# Altium footprint library IC.PcbLib: 386 footprints (part 25 of 30)
Each footprint in its own frame and in the unit in brackets; x right, y up, seen from the top. Pads: shape width x height; smd on the part's side, far side on the other; paste and mask are expansions set on the pad; w line width, h text height; cw(c..) or ccw(c..) is an arc to the next point about the centre after c.
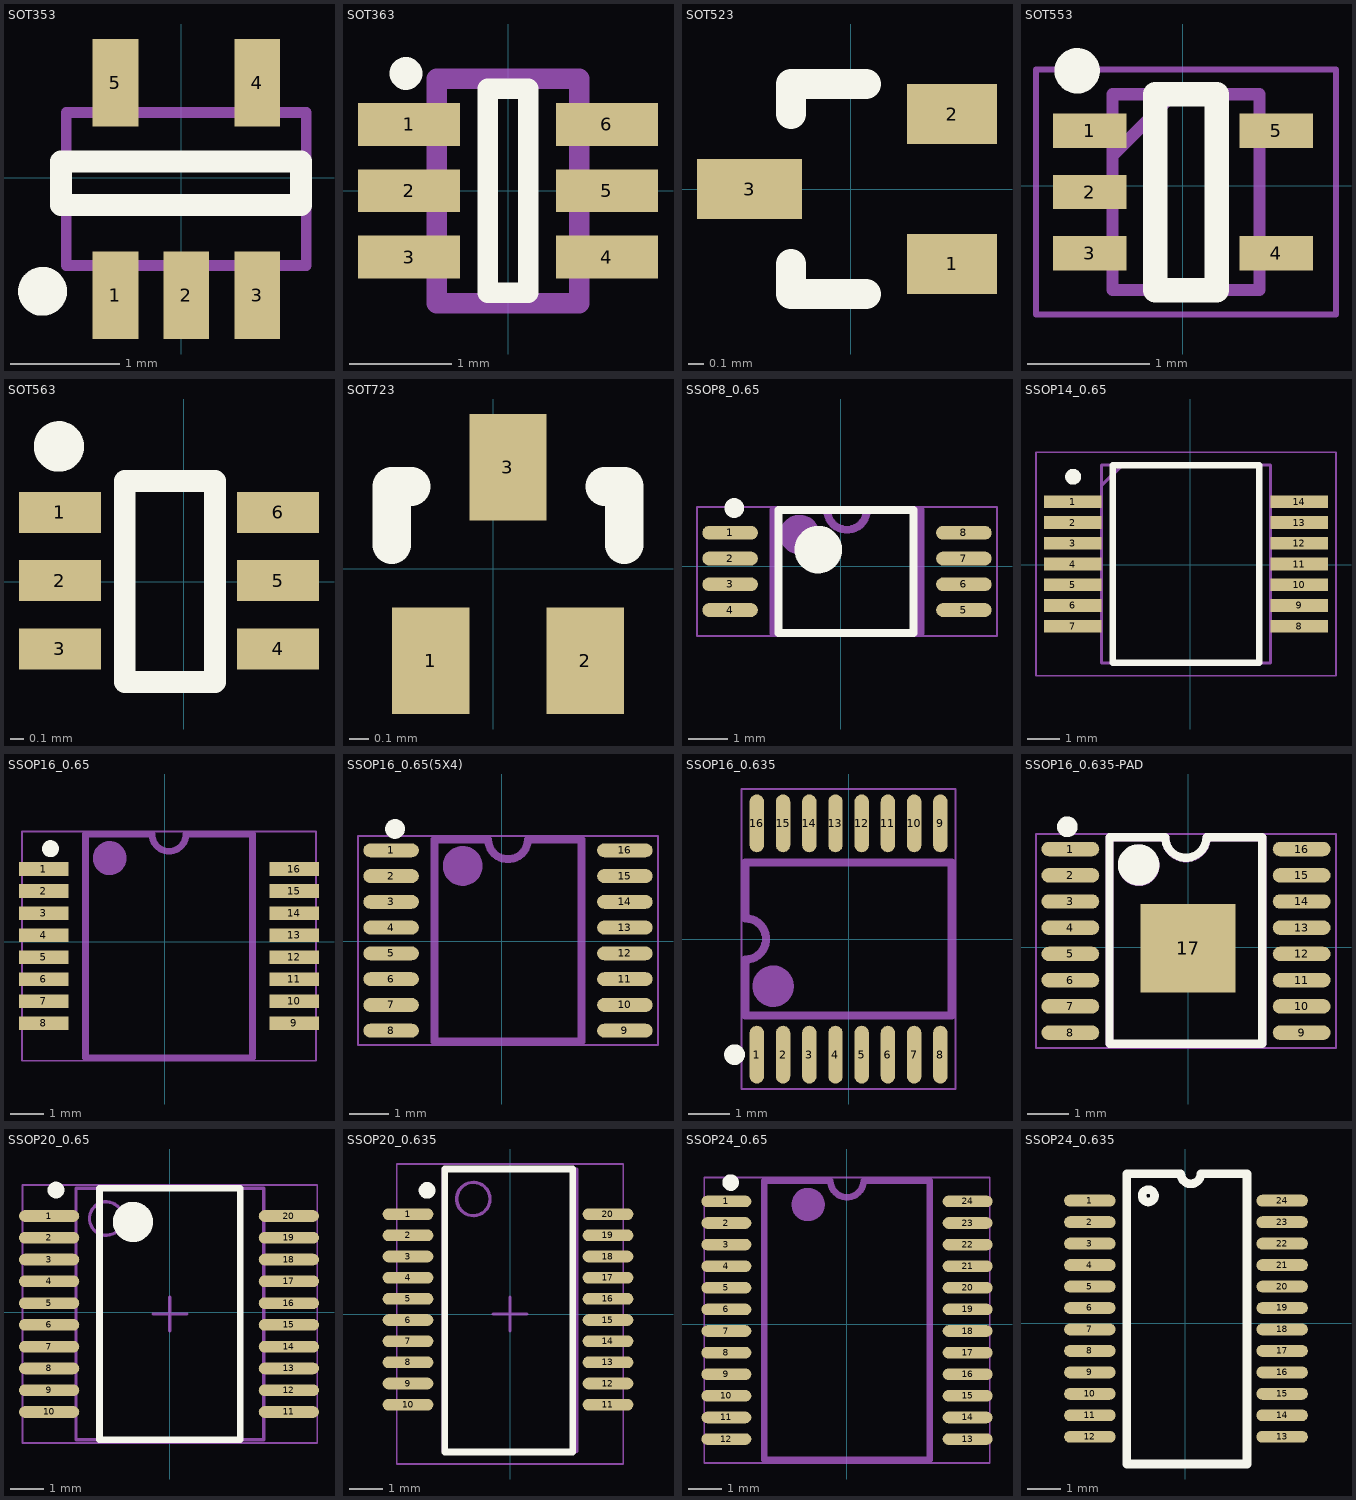
[diagram p24: the footprints below, top view; thin cyan lines are the x and y axes]

## SOT353 [mm]
height 1.45
pads (5):
  rect 0.42x0.8 smd mask+0.051: 1(-0.602,-1.078) 2(0.048,-1.078) 3(0.698,-1.078) 4(0.698,0.872) 5(-0.602,0.872)
Top Overlay:
  circle w0.25: c-1.27,-1.041 r0.099
  lines w0.2: -1.1,-0.251 -1.1,0.149 1.1,0.149 1.1,-0.251 -1.1,-0.251
Mechanical 13:
  lines w0.1: -1.052,-0.803 -1.052,0.597 1.148,0.597 1.148,-0.803 -1.052,-0.803
3D body "User Library-SOT353-1.step": height 1.1, standoff 0, extent -1.052,-1.328 1.148,1.072

## SOT363 [mm]
pads (6):
  rect 1x0.42 smd mask+0.051: 1(-0.97,0.65) 2(-0.97,0) 3(-0.97,-0.65) 4(0.97,-0.65) 5(0.97,0) 6(0.97,0.65)
Top Overlay:
  circle w0.25: c-1,1.15 r0.035
  lines w0.2: -0.2,-1 0.2,-1 0.2,1 -0.2,1 -0.2,-1
Mechanical 13:
  lines w0.2: -0.7,-1.1 -0.7,1.1 0.7,1.1 0.7,-1.1 -0.7,-1.1
3D body "User Library-SOT363-2.STEP": height 1.1, standoff 0, extent -1.2,-1.1 1.2,1.1

## SOT523 [mm]
pads (3):
  rect 0.6x0.4 smd: 1(0.675,-0.5) 2(0.675,0.5)
  rect 0.7x0.4 smd: 3(-0.675,0)
Top Overlay:
  lines w0.2: -0.4,-0.5 -0.4,-0.7 0.1,-0.7 ; -0.4,0.5 -0.4,0.7 0.1,0.7
3D body "User Library-SOT-523.STEP": height 0.8, standoff 0, extent -0.8,-0.8 0.8,0.8

## SOT553 [mm]
height 1.45
pads (5):
  rect 0.6x0.28 smd: 1(-0.762,0.449) 2(-0.762,-0.051) 3(-0.762,-0.551) 4(0.762,-0.551) 5(0.762,0.449)
Top Overlay:
  circle w0.25: c-0.864,0.94 r0.06
  lines w0.2: -0.225,-0.851 0.275,-0.851 0.275,0.749 -0.225,0.749 -0.225,-0.851
Mechanical 13:
  lines w0.1: -0.575,0.249 -0.075,0.749 ; -0.575,-0.851 0.625,-0.851 0.625,0.749 -0.575,0.749 -0.575,-0.851
Mechanical 15:
  lines w0.05: -1.2,-1.051 1.25,-1.051 1.25,0.949 -1.2,0.949 -1.2,-1.051
3D body "User Library-sot-553.STEP": height 0.5, standoff 0, extent -0.8,-0.851 0.8,0.749

## SOT563 [mm]
height 1.45
pads (6):
  rect 0.6x0.3 smd mask+0.051: 1(-0.908,0.507) 2(-0.908,0.007) 3(-0.908,-0.493) 4(0.692,-0.493) 5(0.692,0.007) 6(0.692,0.507)
Top Overlay:
  circle w0.25: c-0.914,0.991 r0.06
  lines w0.16: -0.432,-0.737 -0.432,0.737 0.229,0.737 0.229,-0.737 -0.432,-0.737
3D body "User Library-SOT-563.step": height 0.58, standoff 0, extent -0.92,-0.793 0.705,0.807

## SOT723 [mm]
height 1.45
pads (3):
  rect 0.4x0.55 smd: 1(-0.324,-0.475) 2(0.476,-0.475) 3(0.076,0.525)
Top Overlay:
  lines w0.2: -0.524,0.125 -0.524,0.425 -0.424,0.425 ; 0.576,0.425 0.676,0.425 0.676,0.125
3D body "User Library-SOT-723.STEP": height 0.45, standoff -0.01, extent -0.549,-0.5 0.701,0.55

## SSOP8_0.65 [mm]
height 1.2
pads (8):
  oval 1.4x0.35 smd: 1(-2.798,0.848) 2(-2.798,0.198) 3(-2.798,-0.452) 4(-2.798,-1.102) 5(3.102,-1.102) 6(3.102,-0.452) 7(3.102,0.198) 8(3.102,0.848)
Top Overlay:
  circle w0.25: c-2.692,1.473 r0.125
  circle w0.6: c-0.573,0.423 r0.3
  lines w0.2: -1.573,-1.677 -1.573,1.423 1.827,1.423 1.827,-1.677 -1.573,-1.677
Mechanical 15:
  circle w0.6: c-1.041,0.803 r0.2
  lines w0.05: -3.632,-1.753 3.937,-1.753 3.937,1.499 -3.632,1.499 -3.632,-1.753
  lines w0.2: -1.698,-1.677 2.002,-1.677 2.002,1.423 0.652,1.423 cw(c0.152,1.423) -0.348,1.423 -1.698,1.423 -1.698,-1.677
3D body "User Library-SSOP-8-2.STEP": height 1.3, standoff 0, extent -3.022,-1.852 3.378,1.648

## SSOP14_0.65 [mm]
height 1.2
pads (14):
  rect 1.8x0.4 smd: 1(-3.677,1.975) 2(-3.677,1.325) 3(-3.677,0.675) 4(-3.677,0.025) 5(-3.677,-0.625) 6(-3.677,-1.275) 7(-3.677,-1.925) 8(3.423,-1.925) 9(3.423,-1.275) 10(3.423,-0.625) 11(3.423,0.025) 12(3.423,0.675) 13(3.423,1.325) 14(3.423,1.975)
Top Overlay:
  circle w0.25: c-3.663,2.759 r0.125
  lines w0.2: -2.427,-3.075 2.173,-3.075 2.173,3.125 -2.427,3.125 -2.427,-3.075
Mechanical 13:
  lines w0.1: -2.777,2.475 -2.127,3.125 ; -2.777,-3.075 2.523,-3.075 2.523,3.125 -2.777,3.125 -2.777,-3.075
Mechanical 15:
  lines w0.05: -4.827,-3.475 4.573,-3.475 4.573,3.525 -4.827,3.525 -4.827,-3.475
3D body "NE556DBR.stp": height 2, standoff 0, extent -4.027,-3.075 3.773,3.125

## SSOP16_0.65 [mm]
pads (16):
  rect 1.46x0.4 smd: 1(-3.573,2.148) 2(-3.573,1.498) 3(-3.573,0.848) 4(-3.573,0.198) 5(-3.573,-0.452) 6(-3.573,-1.102) 7(-3.573,-1.752) 8(-3.573,-2.402) 9(3.827,-2.402) 10(3.827,-1.752) 11(3.827,-1.102) 12(3.827,-0.452) 13(3.827,0.198) 14(3.827,0.848) 15(3.827,1.498) 16(3.827,2.148)
Top Overlay:
  circle w0.25: c-3.373,2.749 r0.125
Mechanical 15:
  circle w0.6: c-1.626,2.47 r0.2
  lines w0.05: -4.216,-3.511 -4.216,3.257 4.47,3.257 4.47,-3.511 -4.216,-3.511
  lines w0.2: -2.337,-3.427 -2.337,3.173 -0.373,3.173 ccw(c0.127,3.173) 0.627,3.173 2.591,3.173 2.591,-3.427 -2.337,-3.427
3D body "SSOP16-0.65-1.STEP": height 1.99, standoff 0.01, extent -3.822,-3.289 4.077,3.035

## SSOP16_0.65(5X4) [mm]
pads (16):
  oval 1.4x0.35 smd: 1(-2.798,2.3) 2(-2.798,1.65) 3(-2.798,1) 4(-2.798,0.35) 5(-2.798,-0.3) 6(-2.798,-0.95) 7(-2.798,-1.6) 8(-2.798,-2.25) 9(3.102,-2.25) 10(3.102,-1.6) 11(3.102,-0.95) 12(3.102,-0.3) 13(3.102,0.35) 14(3.102,1) 15(3.102,1.65) 16(3.102,2.3)
Top Overlay:
  circle w0.25: c-2.698,2.84 r0.125
Mechanical 15:
  circle w0.6: c-0.991,1.905 r0.2
  lines w0.05: -3.632,-2.616 -3.632,2.667 3.937,2.667 3.937,-2.616 -3.632,-2.616
  lines w0.2: -1.698,-2.525 -1.698,2.575 -0.348,2.575 ccw(c0.152,2.575) 0.652,2.575 2.002,2.575 2.002,-2.525 -1.698,-2.525
3D body "User Library-ssop16p500x440ls065h200.step": height 2, standoff 0, extent -2.997,-2.475 3.403,2.525

## SSOP16_0.635 [mm]
height 1.1
pads (16):
  oval 0.35x1.4 smd: 1(-2.222,-2.8) 2(-1.587,-2.8) 3(-0.952,-2.8) 4(-0.317,-2.8) 5(0.318,-2.8) 6(0.953,-2.8) 7(1.588,-2.8) 8(2.223,-2.8) 9(2.223,2.8) 10(1.588,2.8) 11(0.953,2.8) 12(0.318,2.8) 13(-0.317,2.8) 14(-0.952,2.8) 15(-1.587,2.8) 16(-2.222,2.8)
Top Overlay:
  circle w0.25: c-2.762,-2.8 r0.125
Mechanical 15:
  circle w0.6: c-1.827,-1.143 r0.2
  lines w0.05: -2.589,-3.632 2.591,-3.632 2.591,3.632 -2.589,3.632 -2.589,-3.632
  lines w0.2: -2.5,-1.85 2.5,-1.85 2.5,1.85 -2.5,1.85 -2.5,0.5 cw(c-2.5,0) -2.5,-0.5 -2.5,-1.85
3D body "SSOP16-0.635.STEP": height 1.1, standoff 0, extent -2.527,-2.997 2.451,2.997

## SSOP16_0.635-PAD [mm]
height 1.1
pads (17):
  oval 1.4x0.35 smd: 1(-2.851,2.375) 2(-2.851,1.74) 3(-2.851,1.105) 4(-2.851,0.47) 5(-2.851,-0.165) 6(-2.851,-0.8) 7(-2.851,-1.435) 8(-2.851,-2.07) 9(2.749,-2.07) 10(2.749,-1.435) 11(2.749,-0.8) 12(2.749,-0.165) 13(2.749,0.47) 14(2.749,1.105) 15(2.749,1.74) 16(2.749,2.375)
  rect 2.3x2.15 smd: 17(0,-0.025)
Top Overlay:
  circle w0.25: c-2.927,2.914 r0.125
  circle w0.6: c-1.198,1.99 r0.2
  lines w0.2: -1.905,-2.337 1.795,-2.337 1.795,2.663 0.445,2.663 cw(c-0.055,2.663) -0.555,2.663 -1.905,2.663 -1.905,-2.337
Mechanical 15:
  circle w0.6: c-1.194,1.979 r0.2
  lines w0.05: -3.683,-2.438 3.581,-2.438 3.581,2.741 -3.683,2.741 -3.683,-2.438
  lines w0.2: -1.901,-2.348 -1.901,2.652 -0.551,2.652 ccw(c-0.051,2.652) 0.449,2.652 1.799,2.652 1.799,-2.348 -1.901,-2.348
3D body "SSOP16-0.635.STEP": height 1.1, standoff 0, extent -3.048,-2.299 2.947,2.68

## SSOP20_0.65 [mm]
pads (20):
  oval 1.8x0.35 smd: 1(-3.603,2.874) 2(-3.603,2.224) 3(-3.603,1.574) 4(-3.603,0.924) 5(-3.603,0.274) 6(-3.603,-0.376) 7(-3.603,-1.026) 8(-3.603,-1.676) 9(-3.603,-2.326) 10(-3.603,-2.976) 11(3.552,-2.976) 12(3.552,-2.326) 13(3.552,-1.676) 14(3.552,-1.026) 15(3.552,-0.376) 16(3.552,0.274) 17(3.552,0.924) 18(3.552,1.574) 19(3.552,2.224) 20(3.552,2.874)
Top Overlay:
  circle w0.25: c-3.4,3.649 r0.125
  circle w0.6: c-1.1,2.699 r0.3
  lines w0.2: -2.1,-3.801 -2.1,3.699 2.1,3.699 2.1,-3.801 -2.1,-3.801
Mechanical 13:
  circle w0.1: c-1.9,2.799 r0.5
  lines w0.1: -2.8,-3.801 -2.8,3.699 2.8,3.699 2.8,-3.801 -2.8,-3.801
Mechanical 15:
  lines w0.05: -4.4,-3.901 -4.4,3.799 4.4,3.799 4.4,-3.901 -4.4,-3.901
  lines w0.1: -0.5,-0.051 0.5,-0.051 ; 0,-0.551 0,0.449
3D body "User Library-SSOP 20 PIN-1.step": height 1.98, standoff -0.01, extent -3.924,-3.716 3.976,3.614

## SSOP20_0.635 [mm]
pads (20):
  oval 1.524x0.35 smd: 1(-3.061,2.995) 2(-3.061,2.36) 3(-3.061,1.725) 4(-3.061,1.09) 5(-3.061,0.455) 6(-3.061,-0.18) 7(-3.061,-0.815) 8(-3.061,-1.45) 9(-3.061,-2.085) 10(-3.061,-2.72) 11(2.939,-2.72) 12(2.939,-2.085) 13(2.939,-1.45) 14(2.939,-0.815) 15(2.939,-0.18) 16(2.939,0.455) 17(2.939,1.09) 18(2.939,1.725) 19(2.939,2.36) 20(2.939,2.995)
Top Overlay:
  circle w0.25: c-2.489,3.708 r0.125
  lines w0.2: -1.956,-4.14 1.88,-4.14 1.88,4.35 -1.956,4.35 -1.956,-4.14
Mechanical 13:
  circle w0.1: c-1.1,3.45 r0.5
  lines w0.1: -2,-4.115 2,-4.115 2,4.35 -2,4.35 -2,-4.115
Mechanical 15:
  lines w0.05: -3.4,-4.5 3.4,-4.5 3.4,4.5 -3.4,4.5 -3.4,-4.5
  lines w0.1: -0.5,0 0.5,0 ; 0,-0.5 0,0.5
3D body "LTC4008EGN#PBF.stp": height 1.75, standoff 0, extent -3.054,-4.158 2.953,4.464

## SSOP24_0.65 [mm] "TSOP, 24-Leads, Body 7.80x4.40mm, Pitch 0.65mm, Thermal Pad 5.16x2.40mm, IPC Low Density"
height 1.2
pads (24):
  oval 1.5x0.35 smd: 1(-3.627,3.702) 2(-3.627,3.052) 3(-3.627,2.402) 4(-3.627,1.752) 5(-3.627,1.102) 6(-3.627,0.452) 7(-3.627,-0.198) 8(-3.627,-0.848) 9(-3.627,-1.498) 10(-3.627,-2.148) 11(-3.627,-2.798) 12(-3.627,-3.448) 13(3.627,-3.448) 14(3.627,-2.798) 15(3.627,-2.148) 16(3.627,-1.498) 17(3.627,-0.848) 18(3.627,-0.198) 19(3.627,0.452) 20(3.627,1.102) 21(3.627,1.752) 22(3.627,2.402) 23(3.627,3.052) 24(3.627,3.702)
Top Overlay:
  circle w0.25: c-3.5,4.267 r0.125
Mechanical 15:
  circle w0.6: c-1.168,3.607 r0.2
  lines w0.05: -4.293,-4.166 -4.293,4.42 4.293,4.42 4.293,-4.166 -4.293,-4.166
  lines w0.2: -2.489,-4.073 2.489,-4.073 2.489,4.327 0.5,4.327 cw(c0,4.327) -0.5,4.327 -2.489,4.327 -2.489,-4.073
3D body "SSOP24-0.65.STEP": height 1.9, standoff 0, extent -3.775,-3.989 3.775,4.243

## SSOP24_0.635 [mm]
pads (24):
  oval 1.524x0.35 smd: 1(-2.825,3.625) 2(-2.825,2.99) 3(-2.825,2.355) 4(-2.825,1.72) 5(-2.825,1.085) 6(-2.825,0.45) 7(-2.825,-0.185) 8(-2.825,-0.82) 9(-2.825,-1.455) 10(-2.825,-2.09) 11(-2.825,-2.725) 12(-2.825,-3.36) 13(2.865,-3.36) 14(2.865,-2.725) 15(2.865,-2.09) 16(2.865,-1.455) 17(2.865,-0.82) 18(2.865,-0.185) 19(2.865,0.45) 20(2.865,1.085) 21(2.865,1.72) 22(2.865,2.355) 23(2.865,2.99) 24(2.865,3.625)
Top Overlay:
  lines w0.254: -1.095,3.586 cw(c-1.095,3.769) -1.069,3.588 ; -1.727,-4.166 1.824,-4.166 1.824,4.416 0.456,4.416 cw(c0.163,4.416) -0.13,4.416 -1.727,4.416 -1.727,-4.166
3D body "User Library-SSOP24.step": height 1.7, standoff -0.01, extent -2.921,-4.223 3.079,4.477